# Altium footprint library MyPcbLib.PcbLib: 222 footprints (part 5 of 14)
Each footprint in its own frame and in the unit in brackets; x right, y up, seen from the top. Pads: shape width x height; smd on the part's side, far side on the other; paste and mask are expansions set on the pad; w line width, h text height; cw(c..) or ccw(c..) is an arc to the next point about the centre after c.
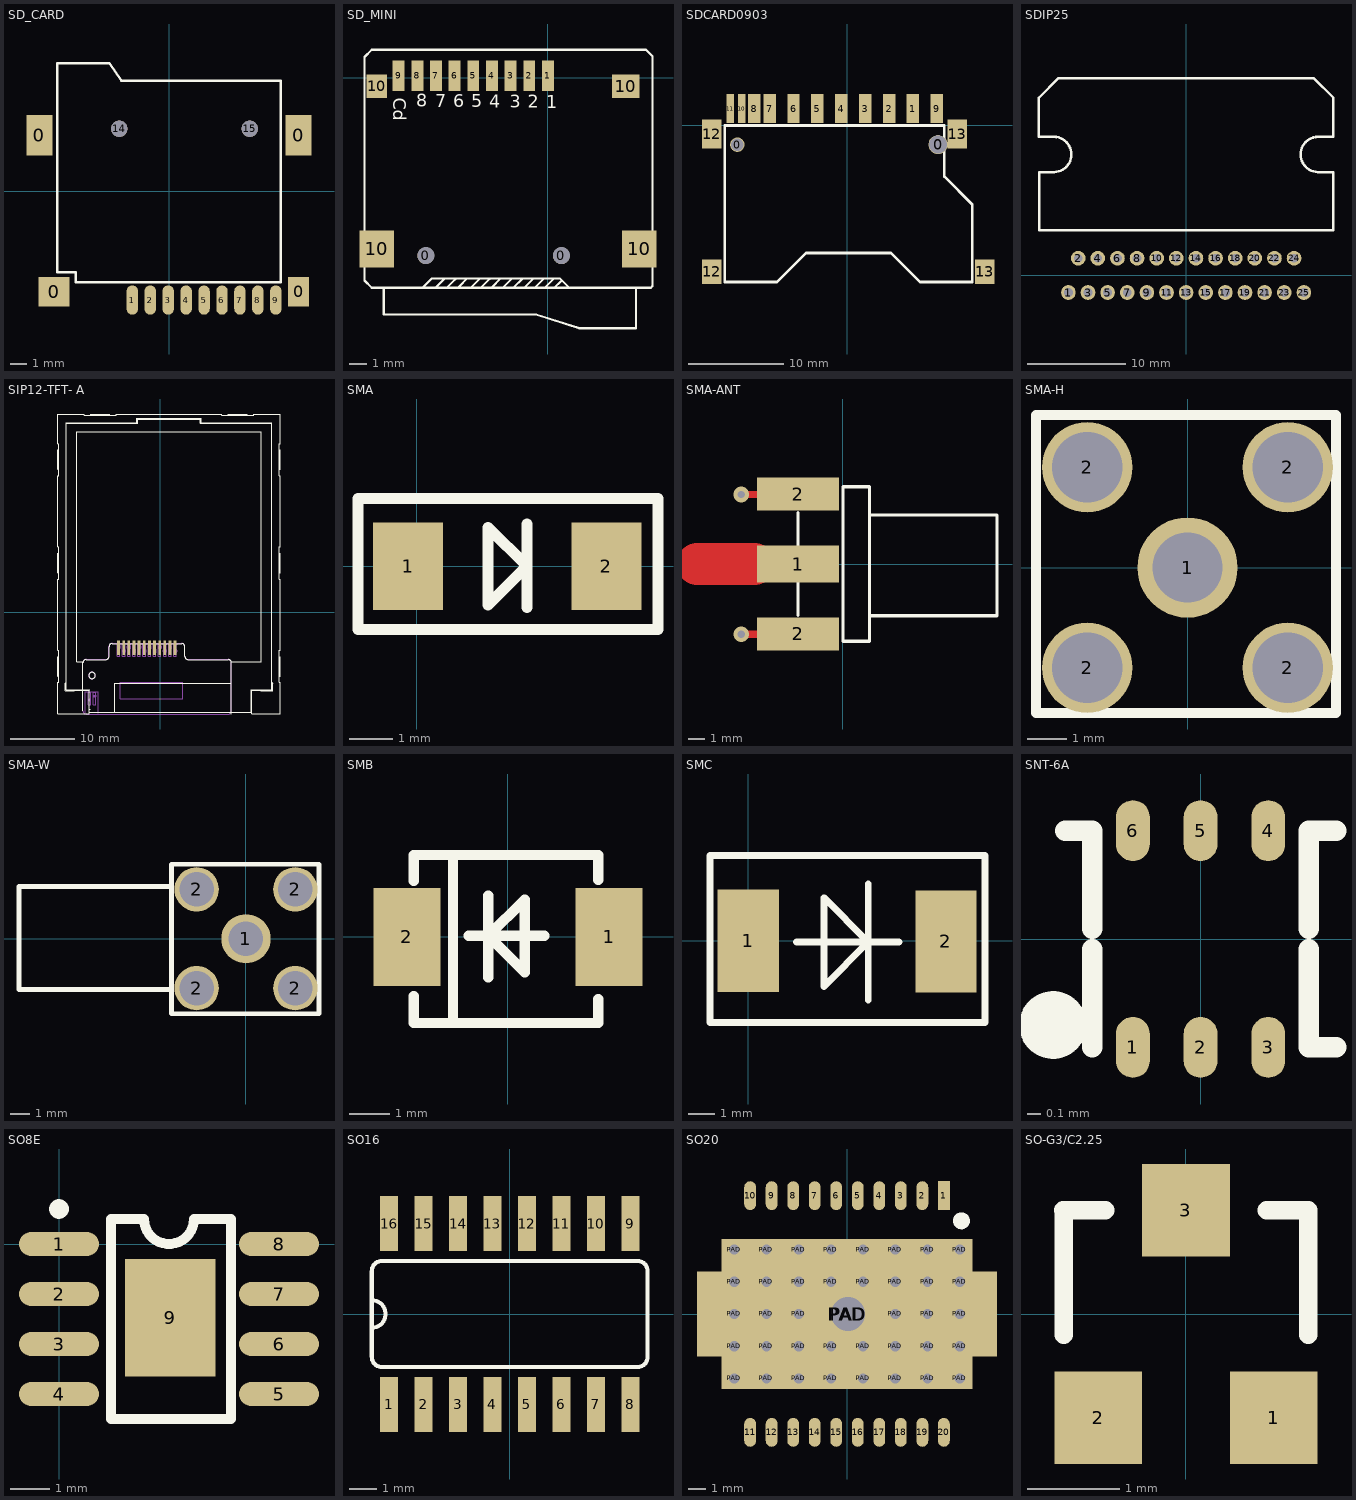
[diagram p4: the footprints below, top view; thin cyan lines are the x and y axes]

## SD_CARD [mm]
pads (15):
  rect 1.6x2.5 smd: 0(-7.953,3.429) 0(7.947,3.429)
  rect 1.9x1.8 smd: 0(-7.053,-6.171)
  rect 1.3x1.8 smd: 0(7.947,-6.171)
  oval 0.7x1.8 smd: 1(-2.253,-6.671) 2(-1.153,-6.671) 3(-0.053,-6.671) 4(1.047,-6.671) 5(2.147,-6.671) 6(3.247,-6.671) 7(4.347,-6.671) 8(5.447,-6.671) 9(6.547,-6.671)
  round 1 hole 1: 14(-3.053,3.829) 15(4.947,3.829)
Top Overlay:
  lines w0.152: -6.858,-4.953 -5.715,-4.953 -5.715,-5.588 -5.08,-5.588 6.401,-5.588 6.858,-5.588 6.858,6.782 -2.921,6.782 -3.658,7.849 -6.858,7.849 -6.858,-4.572 -6.858,-4.953
3D body "SDcard.STEP": height 2.05, standoff -0.4, extent -8,-7.4 8,7.85

## SD_MINI [mm]
pads (15):
  round 1 hole 1 unplated: 0(-7.2,-10.5) 0(0.8,-10.5)
  rect 0.7x1.8 smd: 1(0,0.127) 2(-1.1,0.127) 3(-2.2,0.127) 4(-3.3,0.127) 5(-4.4,0.127) 6(-5.5,0.127) 7(-6.6,0.127) 8(-7.7,0.127) 9(-8.8,0.127)
  rect 2.032x2.2 smd: 10(-10.1,-10.1) 10(5.4,-10.1)
  rect 1.2x1.4 smd: 10(-10.1,-0.5)
  rect 1.6x1.4 smd: 10(4.6,-0.5)
Top Overlay:
  lines w0.127: -9.677,-12.395 -9.677,-13.97 -0.686,-13.97 ; -6.629,-12.395 -6.096,-11.862 -6.096,-11.836 ; -5.969,-12.395 -5.461,-11.887 -5.461,-11.836 ; -5.232,-12.395 -5.232,-12.319 -4.75,-11.836 ; -4.547,-12.395 -3.988,-11.836 -3.962,-11.836 ; -3.962,-12.395 -3.429,-11.862 -3.429,-11.836 ; -3.327,-12.395 -2.769,-11.836 -2.667,-11.836 ; -2.667,-12.395 -2.108,-11.836 -2.083,-11.836 ; -2.032,-12.395 -1.499,-11.862 -1.499,-11.836 ; -1.397,-12.395 -0.838,-11.836 -0.711,-11.836 ; -0.762,-12.395 -0.203,-11.836 -0.178,-11.836 ; -0.711,-13.97 1.854,-14.783 5.207,-14.783 5.207,-12.421 ; -0.178,-12.395 0.381,-11.836 ; 0.381,-12.395 0.787,-11.989 0.864,-11.989 ; -10.389,-12.395 -10.82,-11.963 -10.82,1.219 -10.389,1.651 5.791,1.651 6.172,1.27 6.172,-12.294 6.071,-12.395 ; -10.389,-12.395 6.071,-12.395 ; -10.389,-12.395 -7.391,-12.395 -6.833,-11.836 0.711,-11.836 1.27,-12.395 6.071,-12.395
  text "Cd" at -9.119,-1.168 h0.76
  text "8" at -7.772,-1.727 h0.76
  text "7" at -6.655,-1.753 h0.76
  text "6" at -5.588,-1.753 h0.76
  text "5" at -4.521,-1.753 h0.76
  text "4" at -3.454,-1.778 h0.76
  text "3" at -2.261,-1.778 h0.76
  text "2" at -1.194,-1.778 h0.76
  text "1" at -0.102,-1.803 h0.76
3D body "sdcard.STEP": height 1.8, standoff -0.7, extent -10.372,-14.725 5.901,0.469

## SDCARD0903 [mm] "SD卡插座0903"
pads (17):
  round 1.524 hole 1.321: 0(-11.5,-2)
  round 2 hole 1.9: 0(9.5,-2)
  rect 1.3x3 smd: 1(6.875,1.778) 2(4.375,1.778) 3(1.875,1.778) 4(-0.625,1.778) 5(-3.125,1.778) 6(-5.625,1.778) 7(-8.125,1.778) 8(-9.75,1.778) 9(9.375,1.778)
  rect 0.762x3 smd: 10(-11.05,1.778) 11(-12.25,1.778)
  rect 2.032x2.54 smd: 12(-14.2,-15.3) 13(14.4,-15.3)
  rect 2.032x3.048 smd: 12(-14.2,-0.9) 13(11.5,-0.9)
Top Overlay:
  lines w0.279: -12.827,-16.383 -7.366,-16.383 -4.318,-13.335 0,-13.335 4.572,-13.335 7.62,-16.383 13.081,-16.383 13.081,-8.255 10.16,-5.334 10.16,0 -12.827,0 -12.827,-16.383
3D body "SD Kart.step": height 3, standoff -1, extent -14.224,-28.564 14.376,1.436

## SDIP25 [mm]
pads (25):
  round 1.5 hole 0.9: 1(-12,-1.75) 2(-11,1.75) 3(-10,-1.75) 4(-9,1.75) 5(-8,-1.75) 6(-7,1.75) 7(-6,-1.75) 8(-5,1.75) 9(-4,-1.75) 10(-3,1.75) 11(-2,-1.75) 12(-1,1.75) 13(0,-1.75) 14(1,1.75) 15(2,-1.75) 16(3,1.75) 17(4,-1.75) 18(5,1.75) 19(6,-1.75) 20(7,1.75) 21(8,-1.75) 22(9,1.75) 23(10,-1.75) 24(11,1.75) 25(12,-1.75)
Top Overlay:
  lines w0.254: -14.986,10.505 -14.986,4.6 15,4.6 15,10.53 ; -14.986,10.53 -13.437,10.53 ; -13.538,14.137 -15,14.137 -15,18.1 -13,20.1 13,20.1 15,18.1 15,14.137 ; 13.386,14.137 14.975,14.137 ; 13.437,10.53 14.975,10.53
  lines w0.257: -13.459,14.12 cw(c-13.5,12.321) -13.451,10.521 ; 13.426,14.12 ccw(c13.475,12.321) 13.433,10.521
3D body "HZIP25.step": height 19.2, standoff -2.5, extent -14.063,-1.882 15.138,6.528

## SIP12-TFT- A [mm]
pads (12):
  rect 0.43x2.3 smd: 1(2.305,-5.523) 2(1.505,-5.523) 3(0.705,-5.523) 4(-0.095,-5.523) 5(-0.895,-5.523) 6(-1.695,-5.523) 7(-2.495,-5.523) 8(-3.295,-5.523) 9(-4.095,-5.523) 10(-4.895,-5.523) 11(-5.695,-5.523) 12(-6.495,-5.523)
Top Overlay:
  circle w0.127: c-10.635,-9.83 r0.5
  lines w0.127: -15.793,-9.916 -15.993,-9.916 ; -15.793,-6.916 -15.993,-6.916 ; -15.793,6.184 -15.993,6.184 ; -15.793,9.184 -15.993,9.184 ; -15.793,22.284 -15.993,22.284 ; -15.793,25.284 -15.993,25.284 ; -14.243,-12.202 -14.243,-12.052 ; -12.036,-15.354 -12.036,-7.854 cw(c-11.536,-7.854) -11.536,-7.354 -8.476,-7.354 ccw(c-8.476,-6.854) -7.976,-6.854 -7.976,-5.354 cw(c-7.476,-5.354) -7.476,-4.854 3.324,-4.854 cw(c3.324,-5.354) 3.824,-5.354 3.824,-6.854 ccw(c4.324,-6.854) 4.324,-7.354 10.574,-7.354 cw(c10.574,-7.854) 11.074,-7.854 11.074,-15.516 ; -12.036,-7.696 -13.009,-7.696 -13.009,28.144 15.723,28.144 15.723,-7.696 11.074,-7.696 ; -11.043,-15.566 14.257,-15.566 ; -10.943,-15.516 14.157,-15.516 14.157,-12.052 17.323,-12.052 17.323,29.468 6.257,29.468 6.257,30.084 -3.543,30.084 -3.543,29.468 -14.609,29.468 -14.609,-12.052 -10.943,-12.052 ; -10.943,-15.066 -11.043,-15.066 -10.893,-15.066 ; -10.84,30.684 -10.84,30.884 ; -8.643,-15.566 -8.643,-15.516 ; -7.84,30.684 -7.84,30.884 ; -7.083,-15.494 -7.083,-11.002 11.057,-11.002 11.057,-15.824 ; 10.555,30.684 10.555,30.884 ; 11.857,-15.566 11.857,-15.516 ; 13.555,30.684 13.555,30.884 ; 14.107,-15.066 14.257,-15.066 14.157,-15.066 ; 17.157,-12.202 17.157,-12.052 ; 17.373,-4.466 17.373,22.214 ; 18.507,-9.916 18.707,-9.916 ; 18.507,-6.916 18.707,-6.916 ; 18.507,6.184 18.707,6.184 ; 18.507,9.184 18.707,9.184 ; 18.507,22.284 18.707,22.284 ; 18.507,25.284 18.707,25.284 ; -15.993,-9.916 -15.993,-6.916 ; -15.993,-9.916 -15.993,-6.916 ; -15.993,6.184 -15.993,9.184 ; -15.993,6.184 -15.993,9.184 ; -15.993,22.284 -15.993,25.284 ; -15.993,22.284 -15.993,25.284 ; -10.84,30.884 -7.84,30.884 ; -10.84,30.884 -7.84,30.884 ; 10.555,30.884 13.555,30.884 ; 10.555,30.884 13.555,30.884 ; 18.707,-9.916 18.707,-6.916 ; 18.707,-9.916 18.707,-6.916 ; 18.707,6.184 18.707,9.184 ; 18.707,6.184 18.707,9.184 ; 18.707,22.284 18.707,25.284 ; 18.707,22.284 18.707,25.284 ; -15.993,-15.816 -15.993,-10.916 -15.793,-10.916 -15.793,-5.916 -15.993,-5.916 -15.993,5.184 -15.793,5.184 -15.793,10.184 -15.993,10.184 -15.993,21.284 -15.793,21.284 -15.793,26.284 -15.993,26.284 -15.993,30.884 -11.84,30.884 -11.84,30.684 -6.84,30.684 -6.84,30.884 9.555,30.884 9.555,30.684 14.555,30.684 14.555,30.884 18.707,30.884 18.707,26.284 18.507,26.284 18.507,21.284 18.707,21.284 18.707,10.184 18.507,10.184 18.507,5.184 18.707,5.184 18.707,-5.916 18.507,-5.916 18.507,-10.916 18.707,-10.916 18.707,-15.816 14.257,-15.816 14.257,-12.102 15.527,-12.102 15.657,-12.202 17.473,-12.202 17.473,-11.062 17.373,-10.898 17.373,29.518 6.357,29.518 6.357,30.184 -3.643,30.184 -3.643,29.518 -14.659,29.518 -14.659,-10.898 -14.759,-11.062 -14.759,-12.202 -13.366,-12.202 -13.259,-12.102 -11.043,-12.102 -11.043,-15.816 -15.993,-15.816
Mechanical 3:
  drawing of 186 lines, arcs and shapes, not listed
  text "A" at -10.395,-14.839 h0.41
  text "K" at -11.202,-14.855 h0.41
3D body "LCD.STEP": height 2.2, standoff 0, extent -15.9,-15.68 18.6,30.92

## SMA [mil] "DO-214AC(2010)"
pads (2):
  rect 63x78.74 smd: 1(-8,0) 2(170.56,0)
Top Overlay:
  lines w10: 99,-37 99,38 ; -53,-57 -53,61 217,61 217,-57 -53,-57 ; 64,-35 64,35 99,0 64,-35
3D body "DO-214AC.STEP": height 94.49, standoff 0, extent -7.55,-52.15 173.55,54.15

## SMA-ANT [mil] "142-0701-801/806"
pads (3):
  rect 200x90 smd: 1(-109,0)
  rect 200x80 all layers, no hole: 2(-109,-170) 2(-109,170)
via -247,169 diameter 38 hole 18
via -247,-171 diameter 38 hole 18
Top Layer:
  lines w18: -248,169 -128,169 ; -247,-171 -99,-171
  lines w103: -355,0 -216,0
Top Overlay:
  lines w7.87: -109,-125 -109,125 ; 68,-126 375,-126 375,119 68,119 ; 0,-188 65,-188 65,188 0,188 0,-188
3D body "SMA - 50 Ohm Connectors 142-0701-801.step": height 175.51, standoff -136.3, extent -190.91,-186 370.9,188.8

## SMA-H [mil]
pads (5):
  round 100 hole 70: 1(0,0)
  round 90 hole 70: 2(-100,-100) 2(-100,100) 2(100,-100) 2(100,100)
Top Overlay:
  lines w10: -151,-145 -151,152 148,152 148,-145 -151,-145
3D body "SMA-H.stp": height 105.71, standoff -430.31, extent -124.21,-124.2 124.21,124.22

## SMA-W [mil]
pads (5):
  round 100 hole 70: 1(0,0)
  round 90 hole 70: 2(-100,-100) 2(-100,100) 2(100,-100) 2(100,100)
Top Overlay:
  lines w10: -152,-103 -460,-103 -460,106 -151,106 ; -151,-152 -151,151 148,151 148,-152 -151,-152
3D body "Samtec-SMA-J-P-H-RA-TH1.step": height 108.06, standoff -447.24, extent -459.69,-139.8 134.8,135.79

## SMB [mm] "DO-214AA"
pads (2):
  rect 1.65x2.4 smd: 1(2.475,0) 2(-2.475,0)
Top Overlay:
  lines w0.254: -2.311,-1.448 -2.311,-2.108 2.21,-2.108 2.21,-1.524 ; -2.311,1.372 -2.311,2.007 2.21,2.007 2.21,1.397 ; -1.346,-2.032 -1.346,2.007 ; -0.965,0.025 0.889,0.025 ; -0.483,-0.991 -0.483,1.016 ; -0.483,0.025 0.406,-0.864 0.406,0.914 -0.483,0.025
3D body "DI-214AA(SMB).step": height 2.45, standoff 0.03, extent -2.75,-1.975 2.75,1.925

## SMC [mil] "DO-214AB(2114)"
pads (2):
  rect 90x149.84 smd: 1(0,0)
  rect 90x149.63 smd: 2(290,-1)
Top Overlay:
  lines w10: 71,-2 221,-2 ; 176,-87 176,83 ; -56,-120 -56,125 347,125 347,-120 -56,-120 ; 111,-67 176,-2 111,63 111,-67
3D body "DO-214AB.STEP": height 106.3, standoff 0, extent -14.84,-117.09 304.84,127

## SNT-6A [mm]
height 0.5
pads (6):
  oval 0.25x0.45 smd: 1(-0.5,-0.8) 2(0,-0.8) 3(0.5,-0.8) 4(0.5,0.8) 5(0,0.8) 6(-0.5,0.8)
Top Overlay:
  circle w0.25: c-1.09,-0.635 r0.125
  lines w0.152: -1,0.8 -0.8,0.8 -0.8,0.075 ; -0.8,-0.8 -0.8,-0.075 ; 0.8,-0.075 0.8,-0.8 1,-0.8 ; 0.8,0.075 0.8,0.8 1,0.8
3D body "SNT-6A.STEP": height 0.5, standoff 0, extent -0.799,-0.898 0.799,0.9

## SO8E [mil]
pads (9):
  oval 80x24 smd: 1(0,0) 2(0,-50) 3(0,-100) 4(0,-150) 5(220,-150) 6(220,-100) 7(220,-50) 8(220,0)
  rect 90.55x117.72 smd: 9(111.23,-73.8)
Top Overlay:
  circle w9.84: c0,35 r4.92
  lines w10: 52,-175 172,-175 172,25 135,25 cw(c110,25) 85,25 52,25 52,-175
3D body "SOP8.STEP": height 62.99, standoff 0, extent -7.7,-172.62 230.17,25.02

## SO16 [mil]
pads (16):
  rect 26x80 smd: 1(-175,-131) 2(-125,-131) 3(-75,-131) 4(-25,-131) 5(25,-131) 6(75,-131) 7(125,-131) 8(175,-131) 9(175,131) 10(125,131) 11(75,131) 12(25,131) 13(-25,131) 14(-75,131) 15(-125,131) 16(-175,131)
Top Overlay:
  lines w6: -200,-20 ccw(c-200,0) -200,20 ; -200,-20 -200,20 ; -200,-20 -200,-62 ccw(c-185,-62) -185,-77 185,-77 ccw(c185,-62) 200,-62 200,62 ccw(c185,62) 185,77 -185,77 ccw(c-185,62) -200,62 -200,20
3D body "User Library-SOP16_208mil (5_3mm).STEP": height 70.87, standoff -7.87, extent -200.78,-155.93 200.79,155.92

## SO20 [mm]
pads (63):
  rect 0.7x1.7 smd mask+0.07: 1(5.715,6.985)
  oval 0.7x1.7 smd mask+0.07: 2(4.445,6.985) 3(3.175,6.985) 4(1.905,6.985) 5(0.635,6.985) 6(-0.635,6.985) 7(-1.905,6.985) 8(-3.175,6.985) 9(-4.445,6.985) 10(-5.715,6.985) 11(-5.715,-6.985) 12(-4.445,-6.985) 13(-3.175,-6.985) 14(-1.905,-6.985) 15(-0.635,-6.985) 16(0.635,-6.985) 17(1.905,-6.985) 18(3.175,-6.985) 19(4.445,-6.985) 20(5.715,-6.985)
  round 0.9 hole 0.6 mask+0.06: PAD(-6.65,-3.8) PAD(-6.65,-1.9) PAD(-6.65,0) PAD(-6.65,1.9) PAD(-6.65,3.8) PAD(-4.75,-3.8) PAD(-4.75,-1.9) PAD(-4.75,0) PAD(-4.75,1.9) PAD(-4.75,3.8) PAD(-2.85,-3.8) PAD(-2.85,-1.9) PAD(-2.85,0) PAD(-2.85,1.9) PAD(-2.85,3.8) PAD(-0.95,-3.8) PAD(-0.95,-1.9) PAD(-0.95,1.9) PAD(-0.95,3.8) PAD(0.95,-3.8) PAD(0.95,-1.9) PAD(0.95,1.9) PAD(0.95,3.8) PAD(2.85,-3.8) PAD(2.85,-1.9) PAD(2.85,0) PAD(2.85,1.9) PAD(2.85,3.8) PAD(4.75,-3.8) PAD(4.75,-1.9) PAD(4.75,0) PAD(4.75,1.9) PAD(4.75,3.8) PAD(6.65,-3.8) PAD(6.65,-1.9) PAD(6.65,0) PAD(6.65,1.9) PAD(6.65,3.8)
  rect 17.7x5 smd mask+0.06: PAD(0,0)
  rect 17.7x3 smd mask+0.06: PAD(0,0)
  rect 9.8x6.2 smd mask+0.06: PAD(0,0)
  rect 14.8x8.828 smd mask+0.06: PAD(0,0)
  round 2.5 hole 2 mask+0.06: PAD(0.069,0)
Top Overlay:
  circle w0.5: c6.75,5.5 r0.25
3D body "User Library-PowerSO20.STEP": height 3.6, standoff 0, extent -8,-7.2 8,7.2

## SO-G3/C2.25 [mm] "SOT-23; 3 Leads; Body 3.0 x 2.5 mm, inc. leads (LxW max)"
height 1.2
pads (3):
  rect 0.95x1 smd: 1(0.95,-1.125) 2(-0.95,-1.125) 3(0,1.125)
Top Overlay:
  lines w0.2: -1.328,1.125 -0.875,1.125 ; -1.325,-0.225 -1.325,1.125 ; 0.875,1.125 1.325,1.125 1.325,-0.225
3D body "SOT-23.STEP": height 1.11, standoff 0.01, extent -1.503,-1.26 1.498,1.24